# Altium integrated library LEMO Unipole And Multipole Type Connectors.IntLib: 1566 symbols (part 4 of 13) (continued)
## EPA.1B.307.HLN
designator J?
Elbow receptacle for printed circuit (solder or screw fixing), Key (A), 1B series, Multipole Type with 7 Contacts; Manufacturer: LEMO; PartNumber: EPA.1B.307.HLN; Number of contacts: 7; Contact Diameter: 0.7 mm; AWG: 24; Rated Current(A): 6; DatasheetVersion: Jun-14; PackageReference: EPA.1B.307.HLN; PackageDescription: Elbow receptacle for printed circuit (solder or screw fixing), Key(A) for Printed Circuit; Supplier 1: Mouser; Supplier Part Number 1: 736-EPA1B307HLN; Supplier 2: Digi-Key; Supplier Part Number 2: EPA.1B.307.HLN-ND; ComponentLink1Description: Manufacturer URL; ComponentLink1URL: http://www.lemo.com; ComponentLink2Description: Datasheet; ComponentLink2URL: http://intra.lemo.ch/catalog/ROW/UK_English/unipole_multipole.pdf
footprint EPA.1B.307.HLN (Socket, Female, Height 12.6 mm, Through hole)
pins: 1, 2, 3, 4, 5, 6, 7, 9, 10, 11, 12

## EPA.1B.308.HLN
designator J?
Elbow receptacle for printed circuit (solder or screw fixing), Key (A), 1B series, Multipole Type with 8 Contacts; Manufacturer: LEMO; PartNumber: EPA.1B.308.HLN; Number of contacts: 8; Contact Diameter: 0.7 mm; AWG: 24; Rated Current(A): 2; DatasheetVersion: Jun-14; PackageReference: EPA.1B.308.HLN; PackageDescription: Elbow receptacle for printed circuit (solder or screw fixing), Key(A) for Printed Circuit; Supplier 1: Mouser; Supplier Part Number 1: 736-EPA1B308HLN; Supplier 2: Digi-Key; Supplier Part Number 2: EPA.1B.308.HLN-ND; ComponentLink1Description: Manufacturer URL; ComponentLink1URL: http://www.lemo.com; ComponentLink2Description: Datasheet; ComponentLink2URL: http://intra.lemo.ch/catalog/ROW/UK_English/unipole_multipole.pdf
footprint EPA.1B.308.HLN (Socket, Female, Height 12.6 mm, Through hole)
pins: 1, 2, 3, 4, 5, 6, 7, 8, 10, 11, 12, 13

## EPA.1B.308.HLNS
designator J?
Elbow receptacle for printed circuit (solder or screw fixing), Key (A), 1B series, Multipole Type with 8 Contacts; Manufacturer: LEMO; PartNumber: EPA.1B.308.HLNS; Number of contacts: 8; Contact Diameter: 0.7 mm; AWG: 24; Rated Current(A): 2; DatasheetVersion: Jun-14; PackageReference: EPA.1B.308.HLNS; PackageDescription: Elbow receptacle for printed circuit (solder or screw fixing), Key(A) for Printed Circuit; ComponentLink1Description: Manufacturer URL; ComponentLink1URL: http://www.lemo.com; ComponentLink2Description: Datasheet; ComponentLink2URL: http://intra.lemo.ch/catalog/ROW/UK_English/unipole_multipole.pdf
footprint EPA.1B.308.HLNS (Socket, Female, Height 12.6 mm, Through hole)
pins: 1, 2, 3, 4, 5, 6, 7, 8, 10, 11, 12, 13

## EPA.1B.310.HLN
designator J?
Elbow receptacle for printed circuit (solder or screw fixing), Key (A), 1B series, Multipole Type with 10 Contacts; Manufacturer: LEMO; PartNumber: EPA.1B.310.HLN; Number of contacts: 10; Contact Diameter: 0.5 mm; AWG: 28; Rated Current(A): 1.5.; DatasheetVersion: Jun-14; PackageReference: EPA.1B.310.HLN; PackageDescription: Elbow receptacle for printed circuit (solder or screw fixing), Key(A) for Printed Circuit; ComponentLink1Description: Manufacturer URL; ComponentLink1URL: http://www.lemo.com; ComponentLink2Description: Datasheet; ComponentLink2URL: http://intra.lemo.ch/catalog/ROW/UK_English/unipole_multipole.pdf
footprint EPA.1B.310.HLN (Socket, Female, Height 12.6 mm, Through hole)
pins: 1, 2, 3, 4, 5, 6, 7, 8, 9, 10, 12, 13, 14, 15

## EPA.1B.310.HLNS
designator J?
Elbow receptacle for printed circuit (solder or screw fixing), Key (A), 1B series, Multipole Type with 10 Contacts; Manufacturer: LEMO; PartNumber: EPA.1B.310.HLNS; Number of contacts: 10; Contact Diameter: 0.5 mm; AWG: 28; Rated Current(A): 1.5.; DatasheetVersion: Jun-14; PackageReference: EPA.1B.310.HLNS; PackageDescription: Elbow receptacle for printed circuit (solder or screw fixing), Key(A) for Printed Circuit; ComponentLink1Description: Manufacturer URL; ComponentLink1URL: http://www.lemo.com; ComponentLink2Description: Datasheet; ComponentLink2URL: http://intra.lemo.ch/catalog/ROW/UK_English/unipole_multipole.pdf
footprint EPA.1B.310.HLNS (Socket, Female, Height 12.6 mm, Through hole)
pins: 1, 2, 3, 4, 5, 6, 7, 8, 9, 10, 12, 13, 14, 15

## EPA.1B.314.NLN
designator J?
Elbow receptacle for printed circuit (solder or screw fixing), Key (A), 1B series, Multipole Type with 14 Contacts; Manufacturer: LEMO; PartNumber: EPA.1B.314.NLN; Number of contacts: 14; Contact Diameter: 0.5 mm; AWG: 28; Rated Current(A): 1; DatasheetVersion: Jun-14; PackageReference: EPA.1B.314.NLN; PackageDescription: Elbow receptacle for printed circuit (solder or screw fixing), Key(A) for Printed Circuit; ComponentLink1Description: Manufacturer URL; ComponentLink1URL: http://www.lemo.com; ComponentLink2Description: Datasheet; ComponentLink2URL: http://intra.lemo.ch/catalog/ROW/UK_English/unipole_multipole.pdf
footprint EPA.1B.314.NLN (Socket, Female, Height 15.4 mm, Through hole)
pins: 1, 2, 3, 4, 5, 6, 7, 8, 9, 10, 11, 12, 13, 14, 16, 17, 18, 19

## EPB.0B.302.HLN
designator J?
Elbow receptacle for printed circuit (solder or screw fixing), Key (B), 0B series, Multipole Type with 2 Contacts; Manufacturer: LEMO; PartNumber: EPB.0B.302.HLN; Number of contacts: 2; Contact Diameter: 0.9 mm; AWG: 22; Rated Current(A): 6; DatasheetVersion: Jun-14; PackageReference: EPB.0B.302.HLN; PackageDescription: Elbow receptacle for printed circuit (solder or screw fixing), Key(B) for Printed Circuit; ComponentLink1Description: Manufacturer URL; ComponentLink1URL: http://www.lemo.com; ComponentLink2Description: Datasheet; ComponentLink2URL: http://intra.lemo.ch/catalog/ROW/UK_English/unipole_multipole.pdf
footprint EPB.0B.302.HLN (Socket, Female, Height 11.7 mm, Through hole)
pins: 1, 2, 4, 5, 6, 7

## EPB.0B.304.HLN
designator J?
Elbow receptacle for printed circuit (solder or screw fixing), Key (B), 0B series, Multipole Type with 4 Contacts; Manufacturer: LEMO; PartNumber: EPB.0B.304.HLN; Number of contacts: 4; Contact Diameter: 0.7 mm; AWG: 24; Rated Current(A): 6; DatasheetVersion: Jun-14; PackageReference: EPB.0B.304.HLN; PackageDescription: Elbow receptacle for printed circuit (solder or screw fixing), Key(B) for Printed Circuit; Supplier 1: Mouser; Supplier Part Number 1: 736-EPB0B304HLN; Supplier 2: Digi-Key; Supplier Part Number 2: EPB.0B.304.HLN-ND; ComponentLink1Description: Manufacturer URL; ComponentLink1URL: http://www.lemo.com; ComponentLink2Description: Datasheet; ComponentLink2URL: http://intra.lemo.ch/catalog/ROW/UK_English/unipole_multipole.pdf
footprint EPB.0B.304.HLN (Socket, Female, Height 11.7 mm, Through hole)
pins: 1, 2, 3, 4, 6, 7, 8, 9

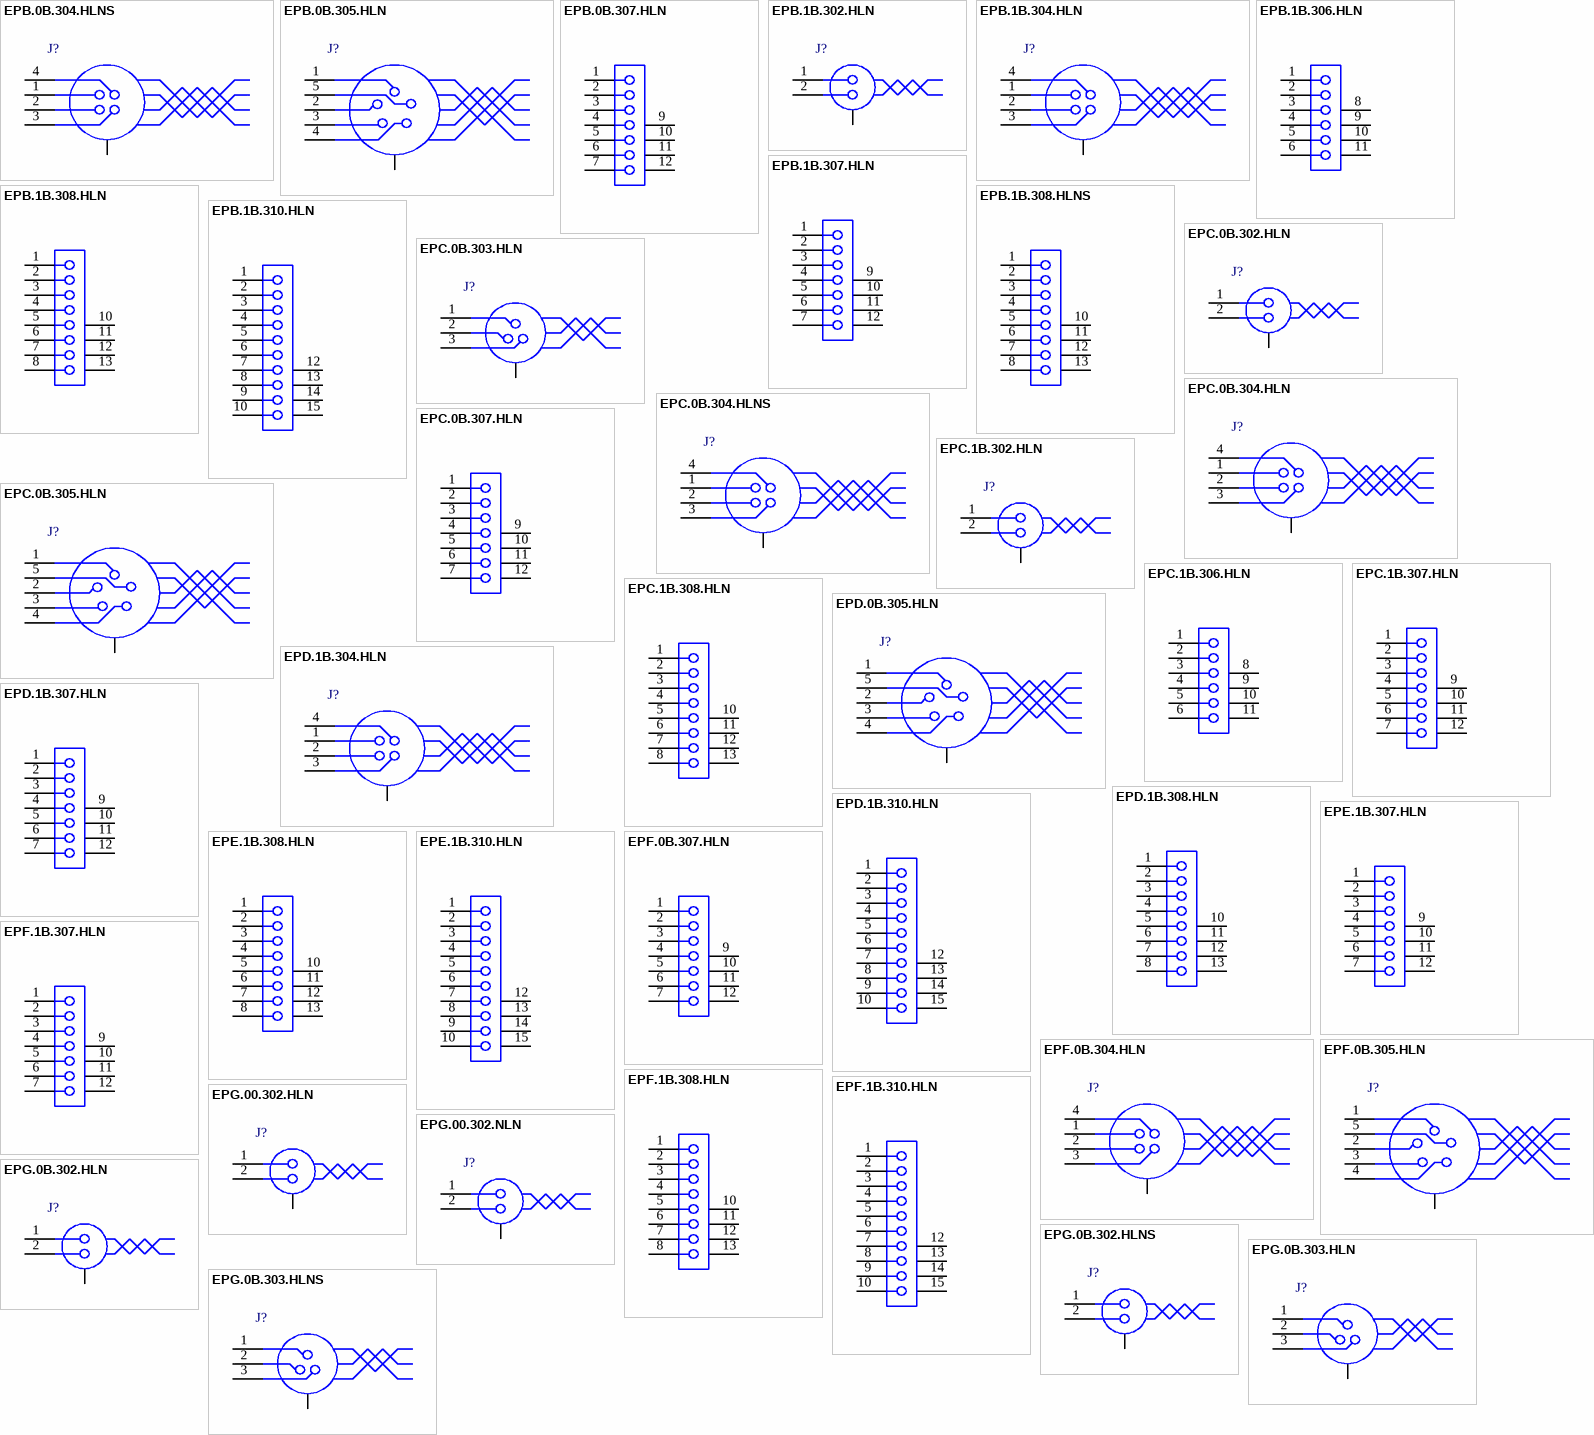
[diagram p13: symbols EPB.0B.304.HLNS to EPG.0B.303.HLNS]

## EPB.0B.304.HLNS
designator J?
Elbow receptacle for printed circuit (solder or screw fixing), Key (B), 0B series, Multipole Type with 4 Contacts; Manufacturer: LEMO; PartNumber: EPB.0B.304.HLNS; Number of contacts: 4; Contact Diameter: 0.7 mm; AWG: 24; Rated Current(A): 6; DatasheetVersion: Jun-14; PackageReference: EPB.0B.304.HLNS; PackageDescription: Elbow receptacle for printed circuit (solder or screw fixing), Key(B) for Printed Circuit; ComponentLink1Description: Manufacturer URL; ComponentLink1URL: http://www.lemo.com; ComponentLink2Description: Datasheet; ComponentLink2URL: http://intra.lemo.ch/catalog/ROW/UK_English/unipole_multipole.pdf
footprint EPB.0B.304.HLNS (Socket, Female, Height 11.7 mm, Through hole)
pins: 1, 2, 3, 4, 6, 7, 8, 9

## EPB.0B.305.HLN
designator J?
Elbow receptacle for printed circuit (solder or screw fixing), Key (B), 0B series, Multipole Type with 5 Contacts; Manufacturer: LEMO; PartNumber: EPB.0B.305.HLN; Number of contacts: 5; Contact Diameter: 0.7 mm; AWG: 24; Rated Current(A): 6; DatasheetVersion: Jun-14; PackageReference: EPB.0B.305.HLN; PackageDescription: Elbow receptacle for printed circuit (solder or screw fixing), Key(B) for Printed Circuit; Supplier 1: Mouser; Supplier Part Number 1: 736-EPB0B305HLN; Supplier 2: Digi-Key; Supplier Part Number 2: EPB.0B.305.HLN-ND; ComponentLink1Description: Manufacturer URL; ComponentLink1URL: http://www.lemo.com; ComponentLink2Description: Datasheet; ComponentLink2URL: http://intra.lemo.ch/catalog/ROW/UK_English/unipole_multipole.pdf
footprint EPB.0B.305.HLN (Socket, Female, Height 11.7 mm, Through hole)
pins: 1, 2, 3, 4, 5, 7, 8, 9, 10

## EPB.0B.307.HLN
designator J?
Elbow receptacle for printed circuit (solder or screw fixing), Key (B), 0B series, Multipole Type with 7 Contacts; Manufacturer: LEMO; PartNumber: EPB.0B.307.HLN; Number of contacts: 7; Contact Diameter: 0.5 mm; AWG: 28; Rated Current(A): 2; DatasheetVersion: Jun-14; PackageReference: EPB.0B.307.HLN; PackageDescription: Elbow receptacle for printed circuit (solder or screw fixing), Key(B) for Printed Circuit; ComponentLink1Description: Manufacturer URL; ComponentLink1URL: http://www.lemo.com; ComponentLink2Description: Datasheet; ComponentLink2URL: http://intra.lemo.ch/catalog/ROW/UK_English/unipole_multipole.pdf
footprint EPB.0B.307.HLN (Socket, Female, Height 11.7 mm, Through hole)
pins: 1, 2, 3, 4, 5, 6, 7, 9, 10, 11, 12

## EPB.1B.302.HLN
designator J?
Elbow receptacle for printed circuit (solder or screw fixing), Key (B), 1B series, Multipole Type with 2 Contacts; Manufacturer: LEMO; PartNumber: EPB.1B.302.HLN; Number of contacts: 2; Contact Diameter: 1.3 mm; AWG: 20; Rated Current(A): 12; DatasheetVersion: Jun-14; PackageReference: EPB.1B.302.HLN; PackageDescription: Elbow receptacle for printed circuit (solder or screw fixing), Key(B) for Printed Circuit; ComponentLink1Description: Manufacturer URL; ComponentLink1URL: http://www.lemo.com; ComponentLink2Description: Datasheet; ComponentLink2URL: http://intra.lemo.ch/catalog/ROW/UK_English/unipole_multipole.pdf
footprint EPB.1B.302.HLN (Socket, Female, Height 12.6 mm, Through hole)
pins: 1, 2, 4, 5, 6, 7

## EPB.1B.304.HLN
designator J?
Elbow receptacle for printed circuit (solder or screw fixing), Key (B), 1B series, Multipole Type with 4 Contacts; Manufacturer: LEMO; PartNumber: EPB.1B.304.HLN; Number of contacts: 4; Contact Diameter: 0.9 mm; AWG: 22; Rated Current(A): 6; DatasheetVersion: Jun-14; PackageReference: EPB.1B.304.HLN; PackageDescription: Elbow receptacle for printed circuit (solder or screw fixing), Key(B) for Printed Circuit; ComponentLink1Description: Manufacturer URL; ComponentLink1URL: http://www.lemo.com; ComponentLink2Description: Datasheet; ComponentLink2URL: http://intra.lemo.ch/catalog/ROW/UK_English/unipole_multipole.pdf
footprint EPB.1B.304.HLN (Socket, Female, Height 12.6 mm, Through hole)
pins: 1, 2, 3, 4, 6, 7, 8, 9

## EPB.1B.306.HLN
designator J?
Elbow receptacle for printed circuit (solder or screw fixing), Key (B), 1B series, Multipole Type with 6 Contacts; Manufacturer: LEMO; PartNumber: EPB.1B.306.HLN; Number of contacts: 6; Contact Diameter: 0.7 mm; AWG: 24; DatasheetVersion: Jun-14; PackageReference: EPB.1B.306.HLN; PackageDescription: Elbow receptacle for printed circuit (solder or screw fixing), Key(B) for Printed Circuit; Supplier 1: Mouser; Supplier Part Number 1: 736-EPB1B306HLN; Supplier 2: Digi-Key; Supplier Part Number 2: EPB.1B.306.HLN-ND; Rated Current(A): 6; ComponentLink1Description: Manufacturer URL; ComponentLink1URL: http://www.lemo.com; ComponentLink2Description: Datasheet; ComponentLink2URL: http://intra.lemo.ch/catalog/ROW/UK_English/unipole_multipole.pdf
footprint EPB.1B.306.HLN (Socket, Female, Height 12.6 mm, Through hole)
pins: 1, 2, 3, 4, 5, 6, 8, 9, 10, 11

## EPB.1B.307.HLN
designator J?
Elbow receptacle for printed circuit (solder or screw fixing), Key (B), 1B series, Multipole Type with 7 Contacts; Manufacturer: LEMO; PartNumber: EPB.1B.307.HLN; Number of contacts: 7; Contact Diameter: 0.7 mm; AWG: 24; Rated Current(A): 6; DatasheetVersion: Jun-14; PackageReference: EPB.1B.307.HLN; PackageDescription: Elbow receptacle for printed circuit (solder or screw fixing), Key(B) for Printed Circuit; Supplier 1: Mouser; Supplier Part Number 1: 736-EPB1B307HLN; Supplier 2: Digi-Key; Supplier Part Number 2: EPB.1B.307.HLN-ND; ComponentLink1Description: Manufacturer URL; ComponentLink1URL: http://www.lemo.com; ComponentLink2Description: Datasheet; ComponentLink2URL: http://intra.lemo.ch/catalog/ROW/UK_English/unipole_multipole.pdf
footprint EPB.1B.307.HLN (Socket, Female, Height 12.6 mm, Through hole)
pins: 1, 2, 3, 4, 5, 6, 7, 9, 10, 11, 12

## EPB.1B.308.HLN
designator J?
Elbow receptacle for printed circuit (solder or screw fixing), Key (B), 1B series, Multipole Type with 8 Contacts; Manufacturer: LEMO; PartNumber: EPB.1B.308.HLN; Number of contacts: 8; Contact Diameter: 0.7 mm; AWG: 24; Rated Current(A): 2; DatasheetVersion: Jun-14; PackageReference: EPB.1B.308.HLN; PackageDescription: Elbow receptacle for printed circuit (solder or screw fixing), Key(B) for Printed Circuit; Supplier 1: Mouser; Supplier Part Number 1: 736-EPB1B308HLN; Supplier 2: Digi-Key; Supplier Part Number 2: EPB.1B.308.HLN-ND; ComponentLink1Description: Manufacturer URL; ComponentLink1URL: http://www.lemo.com; ComponentLink2Description: Datasheet; ComponentLink2URL: http://intra.lemo.ch/catalog/ROW/UK_English/unipole_multipole.pdf
footprint EPB.1B.308.HLN (Socket, Female, Height 12.6 mm, Through hole)
pins: 1, 2, 3, 4, 5, 6, 7, 8, 10, 11, 12, 13

## EPB.1B.308.HLNS
designator J?
Elbow receptacle for printed circuit (solder or screw fixing), Key (B), 1B series, Multipole Type with 8 Contacts; Manufacturer: LEMO; PartNumber: EPB.1B.308.HLNS; Number of contacts: 8; Contact Diameter: 0.7 mm; AWG: 24; Rated Current(A): 2; DatasheetVersion: Jun-14; PackageReference: EPB.1B.308.HLNS; PackageDescription: Elbow receptacle for printed circuit (solder or screw fixing), Key(B) for Printed Circuit; ComponentLink1Description: Manufacturer URL; ComponentLink1URL: http://www.lemo.com; ComponentLink2Description: Datasheet; ComponentLink2URL: http://intra.lemo.ch/catalog/ROW/UK_English/unipole_multipole.pdf
footprint EPB.1B.308.HLNS (Socket, Female, Height 12.6 mm, Through hole)
pins: 1, 2, 3, 4, 5, 6, 7, 8, 10, 11, 12, 13

## EPB.1B.310.HLN
designator J?
Elbow receptacle for printed circuit (solder or screw fixing), Key (B), 1B series, Multipole Type with 10 Contacts; Manufacturer: LEMO; PartNumber: EPB.1B.310.HLN; Number of contacts: 10; Contact Diameter: 0.5 mm; AWG: 28; Rated Current(A): 1.5.; DatasheetVersion: Jun-14; PackageReference: EPB.1B.310.HLN; PackageDescription: Elbow receptacle for printed circuit (solder or screw fixing), Key(B) for Printed Circuit; ComponentLink1Description: Manufacturer URL; ComponentLink1URL: http://www.lemo.com; ComponentLink2Description: Datasheet; ComponentLink2URL: http://intra.lemo.ch/catalog/ROW/UK_English/unipole_multipole.pdf
footprint EPB.1B.310.HLN (Socket, Female, Height 12.6 mm, Through hole)
pins: 1, 2, 3, 4, 5, 6, 7, 8, 9, 10, 12, 13, 14, 15

## EPC.0B.302.HLN
designator J?
Elbow receptacle for printed circuit (solder or screw fixing), Key (C), 0B series, Multipole Type with 2 Contacts; Manufacturer: LEMO; PartNumber: EPC.0B.302.HLN; Number of contacts: 2; Contact Diameter: 0.9 mm; AWG: 22; Rated Current(A): 6; DatasheetVersion: Jun-14; PackageReference: EPC.0B.302.HLN; PackageDescription: Elbow receptacle for printed circuit (solder or screw fixing), Key(C) for Printed Circuit; ComponentLink1Description: Manufacturer URL; ComponentLink1URL: http://www.lemo.com; ComponentLink2Description: Datasheet; ComponentLink2URL: http://intra.lemo.ch/catalog/ROW/UK_English/unipole_multipole.pdf
footprint EPC.0B.302.HLN (Socket, Female, Height 11.7 mm, Through hole)
pins: 1, 2, 4, 5, 6, 7

## EPC.0B.303.HLN
designator J?
Elbow receptacle for printed circuit (solder or screw fixing), Key (C), 0B series, Multipole Type with 3 Contacts; Manufacturer: LEMO; PartNumber: EPC.0B.303.HLN; Number of contacts: 3; Contact Diameter: 0.9 mm; AWG: 22; Rated Current(A): 6; DatasheetVersion: Jun-14; PackageReference: EPC.0B.303.HLN; PackageDescription: Elbow receptacle for printed circuit (solder or screw fixing), Key(C) for Printed Circuit; ComponentLink1Description: Manufacturer URL; ComponentLink1URL: http://www.lemo.com; ComponentLink2Description: Datasheet; ComponentLink2URL: http://intra.lemo.ch/catalog/ROW/UK_English/unipole_multipole.pdf
footprint EPC.0B.303.HLN (Socket, Female, Height 11.7 mm, Through hole)
pins: 1, 2, 3, 5, 6, 7, 8

## EPC.0B.304.HLN
designator J?
Elbow receptacle for printed circuit (solder or screw fixing), Key (C), 0B series, Multipole Type with 4 Contacts; Manufacturer: LEMO; PartNumber: EPC.0B.304.HLN; Number of contacts: 4; Contact Diameter: 0.7 mm; AWG: 24; Rated Current(A): 6; DatasheetVersion: Jun-14; PackageReference: EPC.0B.304.HLN; PackageDescription: Elbow receptacle for printed circuit (solder or screw fixing), Key(C) for Printed Circuit; Supplier 1: Mouser; Supplier Part Number 1: 736-EPC0B304HLN; Supplier 2: Digi-Key; Supplier Part Number 2: EPC.0B.304.HLN-ND; ComponentLink1Description: Manufacturer URL; ComponentLink1URL: http://www.lemo.com; ComponentLink2Description: Datasheet; ComponentLink2URL: http://intra.lemo.ch/catalog/ROW/UK_English/unipole_multipole.pdf
footprint EPC.0B.304.HLN (Socket, Female, Height 11.7 mm, Through hole)
pins: 1, 2, 3, 4, 6, 7, 8, 9

## EPC.0B.304.HLNS
designator J?
Elbow receptacle for printed circuit (solder or screw fixing), Key (C), 0B series, Multipole Type with 4 Contacts; Manufacturer: LEMO; PartNumber: EPC.0B.304.HLNS; Number of contacts: 4; Contact Diameter: 0.7 mm; AWG: 24; Rated Current(A): 6; DatasheetVersion: Jun-14; PackageReference: EPC.0B.304.HLNS; PackageDescription: Elbow receptacle for printed circuit (solder or screw fixing), Key(C) for Printed Circuit; ComponentLink1Description: Manufacturer URL; ComponentLink1URL: http://www.lemo.com; ComponentLink2Description: Datasheet; ComponentLink2URL: http://intra.lemo.ch/catalog/ROW/UK_English/unipole_multipole.pdf
footprint EPC.0B.304.HLNS (Socket, Female, Height 11.7 mm, Through hole)
pins: 1, 2, 3, 4, 6, 7, 8, 9

## EPC.0B.305.HLN
designator J?
Elbow receptacle for printed circuit (solder or screw fixing), Key (C), 0B series, Multipole Type with 5 Contacts; Manufacturer: LEMO; PartNumber: EPC.0B.305.HLN; Number of contacts: 5; Contact Diameter: 0.7 mm; AWG: 24; Rated Current(A): 6; DatasheetVersion: Jun-14; PackageReference: EPC.0B.305.HLN; PackageDescription: Elbow receptacle for printed circuit (solder or screw fixing), Key(C) for Printed Circuit; Supplier 1: Mouser; Supplier Part Number 1: 736-EPC0B305HLN; Supplier 2: Digi-Key; Supplier Part Number 2: EPC.0B.305.HLN-ND; ComponentLink1Description: Manufacturer URL; ComponentLink1URL: http://www.lemo.com; ComponentLink2Description: Datasheet; ComponentLink2URL: http://intra.lemo.ch/catalog/ROW/UK_English/unipole_multipole.pdf
footprint EPC.0B.305.HLN (Socket, Female, Height 11.7 mm, Through hole)
pins: 1, 2, 3, 4, 5, 7, 8, 9, 10

## EPC.0B.307.HLN
designator J?
Elbow receptacle for printed circuit (solder or screw fixing), Key (C), 0B series, Multipole Type with 7 Contacts; Manufacturer: LEMO; PartNumber: EPC.0B.307.HLN; Number of contacts: 7; Contact Diameter: 0.5 mm; AWG: 28; Rated Current(A): 2; DatasheetVersion: Jun-14; PackageReference: EPC.0B.307.HLN; PackageDescription: Elbow receptacle for printed circuit (solder or screw fixing), Key(C) for Printed Circuit; ComponentLink1Description: Manufacturer URL; ComponentLink1URL: http://www.lemo.com; ComponentLink2Description: Datasheet; ComponentLink2URL: http://intra.lemo.ch/catalog/ROW/UK_English/unipole_multipole.pdf
footprint EPC.0B.307.HLN (Socket, Female, Height 11.7 mm, Through hole)
pins: 1, 2, 3, 4, 5, 6, 7, 9, 10, 11, 12

## EPC.1B.302.HLN
designator J?
Elbow receptacle for printed circuit (solder or screw fixing), Key (C), 1B series, Multipole Type with 2 Contacts; Manufacturer: LEMO; PartNumber: EPC.1B.302.HLN; Number of contacts: 2; Contact Diameter: 1.3 mm; AWG: 20; Rated Current(A): 12; DatasheetVersion: Jun-14; PackageReference: EPC.1B.302.HLN; PackageDescription: Elbow receptacle for printed circuit (solder or screw fixing), Key(C) for Printed Circuit; ComponentLink1Description: Manufacturer URL; ComponentLink1URL: http://www.lemo.com; ComponentLink2Description: Datasheet; ComponentLink2URL: http://intra.lemo.ch/catalog/ROW/UK_English/unipole_multipole.pdf
footprint EPC.1B.302.HLN (Socket, Female, Height 12.6 mm, Through hole)
pins: 1, 2, 4, 5, 6, 7

## EPC.1B.306.HLN
designator J?
Elbow receptacle for printed circuit (solder or screw fixing), Key (C), 1B series, Multipole Type with 6 Contacts; Manufacturer: LEMO; PartNumber: EPC.1B.306.HLN; Number of contacts: 6; Contact Diameter: 0.7 mm; AWG: 24; DatasheetVersion: Jun-14; PackageReference: EPC.1B.306.HLN; PackageDescription: Elbow receptacle for printed circuit (solder or screw fixing), Key(C) for Printed Circuit; Rated Current(A): 6; ComponentLink1Description: Manufacturer URL; ComponentLink1URL: http://www.lemo.com; ComponentLink2Description: Datasheet; ComponentLink2URL: http://intra.lemo.ch/catalog/ROW/UK_English/unipole_multipole.pdf
footprint EPC.1B.306.HLN (Socket, Female, Height 12.6 mm, Through hole)
pins: 1, 2, 3, 4, 5, 6, 8, 9, 10, 11

## EPC.1B.307.HLN
designator J?
Elbow receptacle for printed circuit (solder or screw fixing), Key (C), 1B series, Multipole Type with 7 Contacts; Manufacturer: LEMO; PartNumber: EPC.1B.307.HLN; Number of contacts: 7; Contact Diameter: 0.7 mm; AWG: 24; Rated Current(A): 6; DatasheetVersion: Jun-14; PackageReference: EPC.1B.307.HLN; PackageDescription: Elbow receptacle for printed circuit (solder or screw fixing), Key(C) for Printed Circuit; ComponentLink1Description: Manufacturer URL; ComponentLink1URL: http://www.lemo.com; ComponentLink2Description: Datasheet; ComponentLink2URL: http://intra.lemo.ch/catalog/ROW/UK_English/unipole_multipole.pdf
footprint EPC.1B.307.HLN (Socket, Female, Height 12.6 mm, Through hole)
pins: 1, 2, 3, 4, 5, 6, 7, 9, 10, 11, 12

## EPC.1B.308.HLN
designator J?
Elbow receptacle for printed circuit (solder or screw fixing), Key (C), 1B series, Multipole Type with 8 Contacts; Manufacturer: LEMO; PartNumber: EPC.1B.308.HLN; Number of contacts: 8; Contact Diameter: 0.7 mm; AWG: 24; Rated Current(A): 2; DatasheetVersion: Jun-14; PackageReference: EPC.1B.308.HLN; PackageDescription: Elbow receptacle for printed circuit (solder or screw fixing), Key(C) for Printed Circuit; ComponentLink1Description: Manufacturer URL; ComponentLink1URL: http://www.lemo.com; ComponentLink2Description: Datasheet; ComponentLink2URL: http://intra.lemo.ch/catalog/ROW/UK_English/unipole_multipole.pdf
footprint EPC.1B.308.HLN (Socket, Female, Height 12.6 mm, Through hole)
pins: 1, 2, 3, 4, 5, 6, 7, 8, 10, 11, 12, 13

## EPD.0B.305.HLN
designator J?
Elbow receptacle for printed circuit (solder or screw fixing), Key (D), 0B series, Multipole Type with 5 Contacts; Manufacturer: LEMO; PartNumber: EPD.0B.305.HLN; Number of contacts: 5; Contact Diameter: 0.7 mm; AWG: 24; Rated Current(A): 6; DatasheetVersion: Jun-14; PackageReference: EPD.0B.305.HLN; PackageDescription: Elbow receptacle for printed circuit (solder or screw fixing), Key(D) for Printed Circuit; ComponentLink1Description: Manufacturer URL; ComponentLink1URL: http://www.lemo.com; ComponentLink2Description: Datasheet; ComponentLink2URL: http://intra.lemo.ch/catalog/ROW/UK_English/unipole_multipole.pdf
footprint EPD.0B.305.HLN (Socket, Female, Height 11.7 mm, Through hole)
pins: 1, 2, 3, 4, 5, 7, 8, 9, 10

## EPD.1B.304.HLN
designator J?
Elbow receptacle for printed circuit (solder or screw fixing), Key (D), 1B series, Multipole Type with 4 Contacts; Manufacturer: LEMO; PartNumber: EPD.1B.304.HLN; Number of contacts: 4; Contact Diameter: 0.9 mm; AWG: 22; Rated Current(A): 6; DatasheetVersion: Jun-14; PackageReference: EPD.1B.304.HLN; PackageDescription: Elbow receptacle for printed circuit (solder or screw fixing), Key(D) for Printed Circuit; ComponentLink1Description: Manufacturer URL; ComponentLink1URL: http://www.lemo.com; ComponentLink2Description: Datasheet; ComponentLink2URL: http://intra.lemo.ch/catalog/ROW/UK_English/unipole_multipole.pdf
footprint EPD.1B.304.HLN (Socket, Female, Height 12.6 mm, Through hole)
pins: 1, 2, 3, 4, 6, 7, 8, 9

## EPD.1B.307.HLN
designator J?
Elbow receptacle for printed circuit (solder or screw fixing), Key (D), 1B series, Multipole Type with 7 Contacts; Manufacturer: LEMO; PartNumber: EPD.1B.307.HLN; Number of contacts: 7; Contact Diameter: 0.7 mm; AWG: 24; Rated Current(A): 6; DatasheetVersion: Jun-14; PackageReference: EPD.1B.307.HLN; PackageDescription: Elbow receptacle for printed circuit (solder or screw fixing), Key(D) for Printed Circuit; ComponentLink1Description: Manufacturer URL; ComponentLink1URL: http://www.lemo.com; ComponentLink2Description: Datasheet; ComponentLink2URL: http://intra.lemo.ch/catalog/ROW/UK_English/unipole_multipole.pdf
footprint EPD.1B.307.HLN (Socket, Female, Height 12.6 mm, Through hole)
pins: 1, 2, 3, 4, 5, 6, 7, 9, 10, 11, 12

## EPD.1B.308.HLN
designator J?
Elbow receptacle for printed circuit (solder or screw fixing), Key (D), 1B series, Multipole Type with 8 Contacts; Manufacturer: LEMO; PartNumber: EPD.1B.308.HLN; Number of contacts: 8; Contact Diameter: 0.7 mm; AWG: 24; Rated Current(A): 2; DatasheetVersion: Jun-14; PackageReference: EPD.1B.308.HLN; PackageDescription: Elbow receptacle for printed circuit (solder or screw fixing), Key(D) for Printed Circuit; ComponentLink1Description: Manufacturer URL; ComponentLink1URL: http://www.lemo.com; ComponentLink2Description: Datasheet; ComponentLink2URL: http://intra.lemo.ch/catalog/ROW/UK_English/unipole_multipole.pdf
footprint EPD.1B.308.HLN (Socket, Female, Height 12.6 mm, Through hole)
pins: 1, 2, 3, 4, 5, 6, 7, 8, 10, 11, 12, 13

## EPD.1B.310.HLN
designator J?
Elbow receptacle for printed circuit (solder or screw fixing), Key (D), 1B series, Multipole Type with 10 Contacts; Manufacturer: LEMO; PartNumber: EPD.1B.310.HLN; Number of contacts: 10; Contact Diameter: 0.5 mm; AWG: 28; Rated Current(A): 1.5.; DatasheetVersion: Jun-14; PackageReference: EPD.1B.310.HLN; PackageDescription: Elbow receptacle for printed circuit (solder or screw fixing), Key(D) for Printed Circuit; ComponentLink1Description: Manufacturer URL; ComponentLink1URL: http://www.lemo.com; ComponentLink2Description: Datasheet; ComponentLink2URL: http://intra.lemo.ch/catalog/ROW/UK_English/unipole_multipole.pdf
footprint EPD.1B.310.HLN (Socket, Female, Height 12.6 mm, Through hole)
pins: 1, 2, 3, 4, 5, 6, 7, 8, 9, 10, 12, 13, 14, 15

## EPE.1B.307.HLN
designator J?
Elbow receptacle for printed circuit (solder or screw fixing), Key (E), 1B series, Multipole Type with 7 Contacts; Manufacturer: LEMO; PartNumber: EPE.1B.307.HLN; Number of contacts: 7; Contact Diameter: 0.7 mm; AWG: 24; Rated Current(A): 6; DatasheetVersion: Jun-14; PackageReference: EPE.1B.307.HLN; PackageDescription: Elbow receptacle for printed circuit (solder or screw fixing), Key(E) for Printed Circuit; ComponentLink1Description: Manufacturer URL; ComponentLink1URL: http://www.lemo.com; ComponentLink2Description: Datasheet; ComponentLink2URL: http://intra.lemo.ch/catalog/ROW/UK_English/unipole_multipole.pdf
footprint EPE.1B.307.HLN (Socket, Female, Height 12.6 mm, Through hole)
pins: 1, 2, 3, 4, 5, 6, 7, 9, 10, 11, 12

## EPE.1B.308.HLN
designator J?
Elbow receptacle for printed circuit (solder or screw fixing), Key (E), 1B series, Multipole Type with 8 Contacts; Manufacturer: LEMO; PartNumber: EPE.1B.308.HLN; Number of contacts: 8; Contact Diameter: 0.7 mm; AWG: 24; Rated Current(A): 2; DatasheetVersion: Jun-14; PackageReference: EPE.1B.308.HLN; PackageDescription: Elbow receptacle for printed circuit (solder or screw fixing), Key(E) for Printed Circuit; ComponentLink1Description: Manufacturer URL; ComponentLink1URL: http://www.lemo.com; ComponentLink2Description: Datasheet; ComponentLink2URL: http://intra.lemo.ch/catalog/ROW/UK_English/unipole_multipole.pdf
footprint EPE.1B.308.HLN (Socket, Female, Height 12.6 mm, Through hole)
pins: 1, 2, 3, 4, 5, 6, 7, 8, 10, 11, 12, 13